# Altium footprint library PcbLib.PcbLib: 68 footprints (part 4 of 5)
Each footprint in its own frame and in the unit in brackets; x right, y up, seen from the top. Pads: shape width x height; smd on the part's side, far side on the other; paste and mask are expansions set on the pad; w line width, h text height; cw(c..) or ccw(c..) is an arc to the next point about the centre after c.
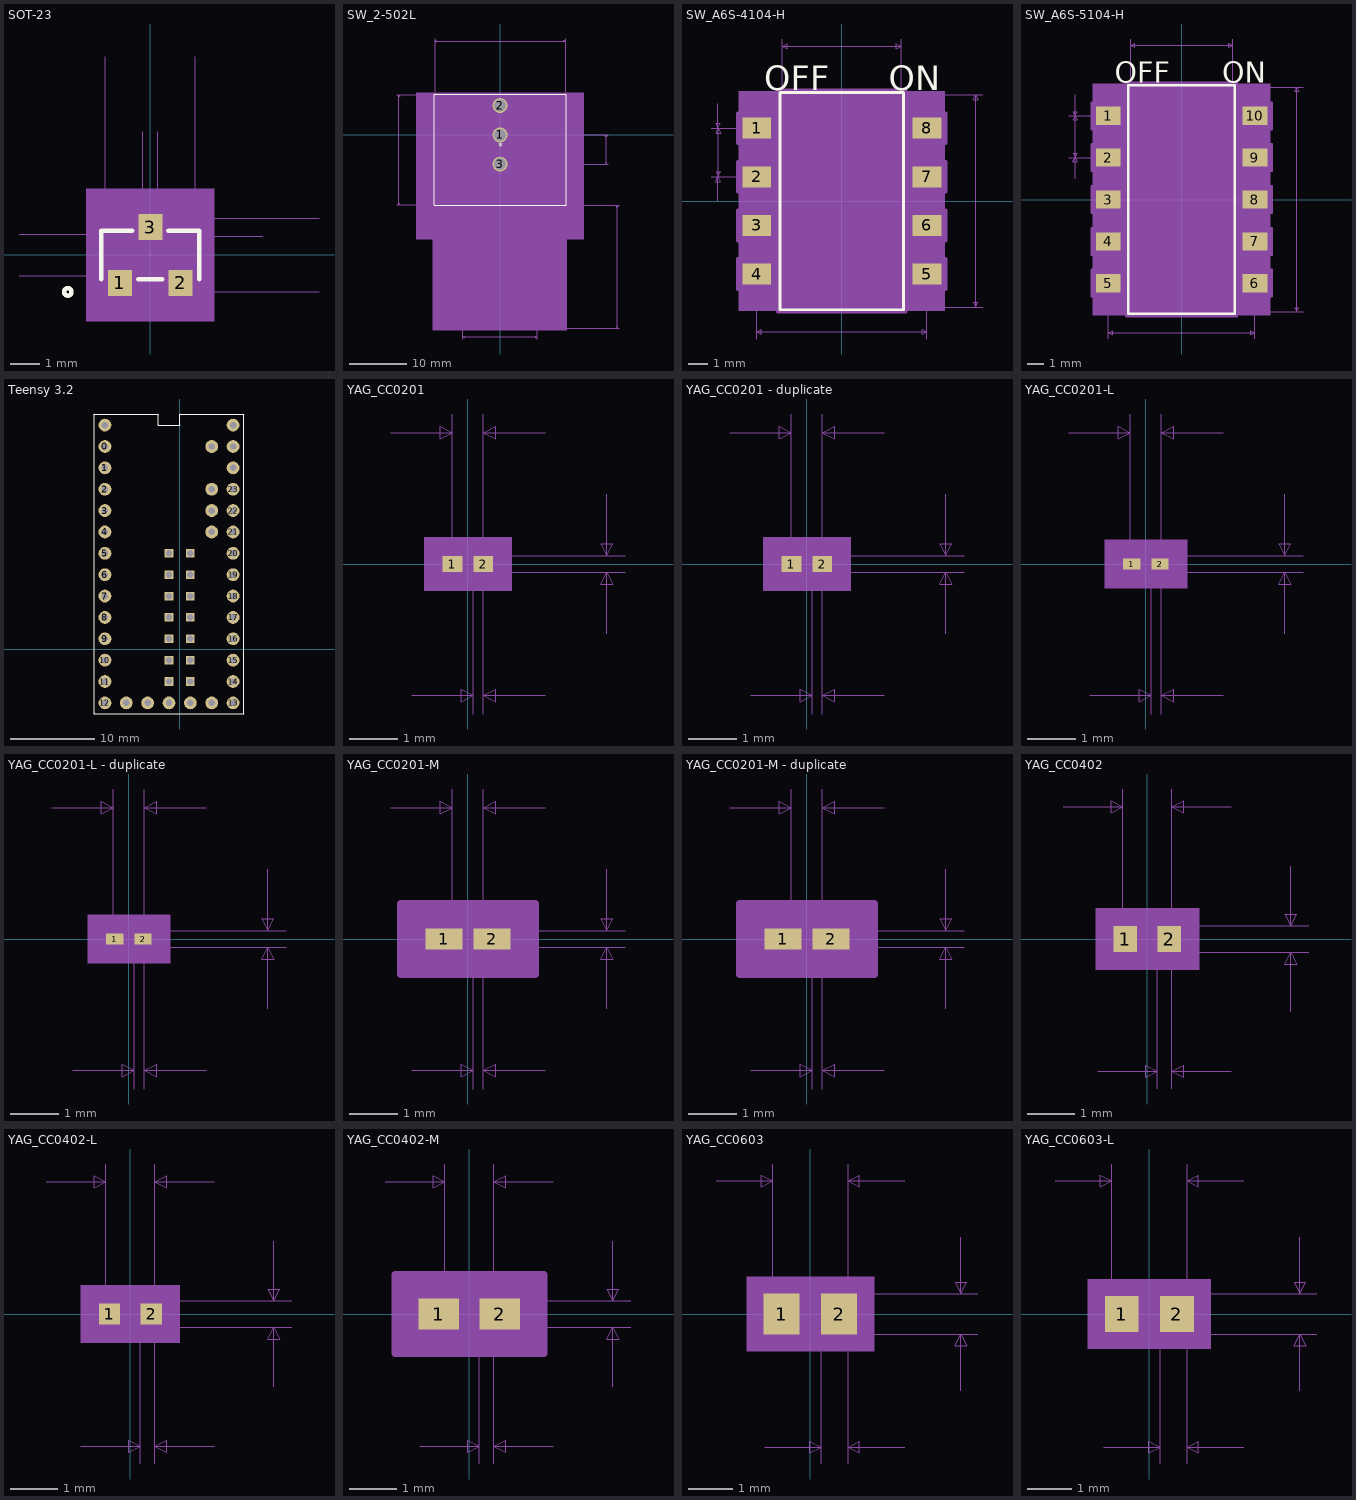
[diagram p3: the footprints below, top view; thin cyan lines are the x and y axes]

## SOT-23 [mil]
pads (3):
  rect 32x35 smd paste+0 mask+0: 1(-40.35,-37.2) 2(40.35,-37.2) 3(0,37.2)
Top Overlay:
  circle w6: c-110.04,-49.21 r5
  lines w6: -65.04,-32.56 -65.04,32.56 -24.14,32.56 ; -16.21,-32.56 16.21,-32.56 ; 24.14,32.56 65.04,32.56 65.04,-32.56
Mechanical 5:
  region: -85.04,88.21 85.04,88.21 85.04,-88.21 -85.04,-88.21
Mechanical 7:
  lines w1: -175.04,-27.56 0,-27.56 ; -175.04,27.56 0,27.56 ; -60.04,27.56 -60.04,264.21 ; -10.04,49.21 -10.04,164.21 ; 0,-49.21 225.04,-49.21 ; 0,25.2 150.04,25.2 ; 10.04,49.21 10.04,164.21 ; 60.04,27.56 60.04,264.21 ; 150.04,49.21 0,49.21 225.04,49.21
Mechanical 13:
  circle w0: c-50.04,-17.56 r5
  lines w1: -60.04,-27.56 60.04,-27.56 60.04,27.56 -60.04,27.56 -60.04,-27.56 ; -50.39,-49.21 -50.39,-27.56 -30.32,-27.56 -30.32,-49.21 -50.39,-49.21 ; -10.04,27.56 10.04,27.56 10.04,49.21 -10.04,49.21 -10.04,27.56 ; 30.32,-49.21 30.32,-27.56 50.39,-27.56 50.39,-49.21 30.32,-49.21
Mechanical 15:
  region: -70.04,-37.56 -70.04,37.56 -20.04,37.56 -20.04,60 20,60 20.04,37.56 70.04,37.56 70.04,-37.56 60.39,-37.56 60.39,-60 -60.39,-60 -60.39,-37.56
  region: 60.04,-27.56 -60.04,-27.56 -60.04,27.56 60.04,27.56
  lines w6: -60.39,-60 -60.39,-37.56 -70.04,-37.56 -70.04,37.56 -20.04,37.56 -20,60 ; -60,-60 60,-60 ; -20.04,60 20.04,60 20.04,37.56 70.04,37.56 70.04,-37.56 60.39,-37.56 60.39,-60
3D body: height 10, standoff 0, extent 0,0 10,10

## SW_2-502L [mil]
pads (3):
  round 102 hole 82 mask+0: 1(0,0) 2(0,200) 3(0,-200)
Top Overlay:
  lines w6: -450,-480.19 450,-480.19 450,276.81 -450,276.81 -450,-480.19
  text "*" at -12.5,-100 h50
Mechanical 5:
  region: -570,286.81 570,286.81 570,-710.19 -570,-710.19
Mechanical 7:
  lines w1: -704.93,-475.19 -445,-475.19 ; -704.93,271.81 -445,271.81 -445,653.51 ; -255,-1391.55 -255,-1319.19 ; 0,-200 737.63,-200 ; 0,0 737.63,0 ; 255,-1391.55 255,-1319.19 813.44,-1319.19 ; 255,-480.19 813.44,-480.19 ; 445,271.81 445,653.51 ; -689.93,-475.19 -689.93,271.81 ; -689.93,-475.19 -694.93,-465.19 -684.93,-465.19 -689.93,-475.19 ; -689.93,271.81 -684.93,261.81 -694.93,261.81 -689.93,271.81 ; -445,638.51 445,638.51 ; -445,638.51 -435,643.5 -435,633.51 -445,638.51 ; -255,-1376.55 255,-1376.55 ; -255,-1376.55 -245,-1371.55 -245,-1381.55 -255,-1376.55 ; 255,-1376.55 245,-1381.55 245,-1371.55 255,-1376.55 ; 445,638.51 435,633.51 435,643.5 445,638.51 ; 722.63,-200 722.63,0 ; 722.63,-200 717.63,-190 727.63,-190 722.63,-200 ; 722.63,0 727.63,-10 717.63,-10 722.63,0 ; 798.44,-1319.19 798.44,-480.19 ; 798.44,-1319.19 793.44,-1309.19 803.44,-1309.19 798.44,-1319.19 ; 798.44,-480.19 803.44,-490.19 793.44,-490.19 798.44,-480.19
  text "Default Padstyle: EX102Y102D82P" at -387.5,-1469.19 h50
  text "First Mounting Padstyle: EX43Y43D50P" at -450,-1529.19 h50
  text "Second Mounting Padstyle: EX70Y70D70P" at -462.5,-1589.19 h50
  text "Alt 1 Padstyle: OX60Y90D30P" at -337.5,-1649.19 h50
  text "Alt 2 Padstyle: OX90Y60D30P" at -337.5,-1709.19 h50
  text "0.89in/22.606mm" at -93.75,658.51 h25
  text "0.747in/18.974mm" at -909.93,-114.19 h25
  text "0.2in/5.08mm" at 742.63,-112.5 h25
  text "0.839in/21.311mm" at 818.44,-912.19 h25
  text "0.51in/12.954mm" at -93.75,-1421.55 h25
Mechanical 13:
  lines w1: -255,-475.19 -255,-1319.19 255,-1319.19 255,-475.19 ; -445,-475.19 445,-475.19 445,271.81 -445,271.81 -445,-475.19
  text "*" at -87.5,-25 h50
Mechanical 15:
  region: 455,281.81 -455,281.81 -455,-1329.19 455,-1329.19
  region: 445,271.81 -445,271.81 -445,-475.19 445,-475.19
  lines w6: -455,-1329.19 -455,281.81 455,281.81 455,-1329.19 -455,-1329.19
3D body: height 10, standoff 0, extent 0,0 10,10

## SW_A6S-4104-H [mm]
pads (8):
  rect 1.5x1.1 smd paste+0 mask+0: 1(-4.45,3.81) 2(-4.45,1.27) 3(-4.45,-1.27) 4(-4.45,-3.81) 5(4.45,-3.81) 6(4.45,-1.27) 7(4.45,1.27) 8(4.45,3.81)
Top Overlay:
  lines w0.152: -3.227,-5.677 -3.227,5.677 3.227,5.677 3.227,-5.677 -3.227,-5.677
  text "OFF" at -4.052,5.804 h1.27
  text "ON" at 2.465,5.804 h1.27
Mechanical 5:
  region: 5.39,-5.741 -5.39,-5.741 -5.39,5.741 5.39,5.741
Mechanical 7:
  lines w0.025: -6.827,1.27 -4.45,1.27 -6.724,1.27 ; -6.827,3.81 -4.45,3.81 -6.724,3.81 ; -6.47,0 -6.47,1.27 ; -6.47,5.08 -6.47,3.81 ; -4.45,-7.205 -4.45,-3.81 -4.45,-7.074 ; -3.18,-6.82 -4.45,-6.82 ; -3.1,3.81 -3.1,8.471 ; 3.1,3.81 3.1,8.471 ; 3.18,-6.82 4.45,-6.82 ; 4.45,-7.205 4.45,-3.81 4.45,-7.074 ; 4.45,-5.55 7.371,-5.55 ; 4.45,5.55 7.371,5.55 ; -6.47,1.27 -6.597,1.016 -6.343,1.016 -6.47,1.27 ; -6.47,3.81 -6.597,4.064 -6.343,4.064 -6.47,3.81 ; -6.446,1.27 -6.573,1.524 -6.319,1.524 -6.446,1.27 ; -6.446,1.27 -6.446,3.81 ; -6.446,3.81 -6.573,3.556 -6.319,3.556 -6.446,3.81 ; -4.45,-6.824 -4.196,-6.951 -4.196,-6.697 -4.45,-6.824 ; -4.45,-6.824 4.45,-6.824 ; -4.45,-6.82 -4.196,-6.693 -4.196,-6.947 -4.45,-6.82 ; -3.1,8.09 -2.846,7.963 -2.846,8.217 -3.1,8.09 ; -3.1,8.09 3.1,8.09 ; 3.1,8.09 2.846,7.963 2.846,8.217 3.1,8.09 ; 4.45,-6.824 4.196,-6.697 4.196,-6.951 4.45,-6.824 ; 4.45,-6.82 4.196,-6.693 4.196,-6.947 4.45,-6.82 ; 6.99,-5.55 7.117,-5.296 6.863,-5.296 6.99,-5.55 ; 6.99,-5.55 6.99,5.55 ; 6.99,5.55 7.117,5.296 6.863,5.296 6.99,5.55
  text "0.437in/11.1mm" at 7.498,-0.318 h0.64
  text "0.244in/6.2mm" at -2.064,8.598 h0.64
  text "Alt 2 Padstyle: OX90Y60D30P" at -8.572,-18.25 h1.27
  text "Alt 1 Padstyle: OX60Y90D30P" at -8.572,-16.726 h1.27
  text "Default Padstyle: RX59p06Y43p31D0T" at -10.795,-12.154 h1.27
  text "0.35in/8.9mm" at -1.905,-7.967 h0.64
  text "0.1in/2.54mm" at -10.764,2.222 h0.64
Mechanical 13:
  region: 0,-4.36 0,-3.26 1.55,-3.26 1.55,-4.36
  region: 0,-1.82 0,-0.72 1.55,-0.72 1.55,-1.82
  region: 0,0.72 0,1.82 1.55,1.82 1.55,0.72
  region: 0,3.26 0,4.36 1.55,4.36 1.55,3.26
  lines w0: -0.305,5.55 ccw(c0,5.55) 0.305,5.55
  lines w0.025: -3.1,-5.55 -3.1,5.55 3.1,5.55 3.1,-5.55 -3.1,-5.55 ; -1.55,-4.36 -1.55,-3.26 1.55,-3.26 1.55,-4.36 -1.55,-4.36 ; -1.55,-1.82 -1.55,-0.72 1.55,-0.72 1.55,-1.82 -1.55,-1.82 ; -1.55,0.72 -1.55,1.82 1.55,1.82 1.55,0.72 -1.55,0.72 ; -1.55,3.26 -1.55,4.36 1.55,4.36 1.55,3.26 -1.55,3.26
  text "OFF" at -4.052,5.804 h1.27
  text "ON" at 2.465,5.804 h1.27
Mechanical 15:
  region: -3.354,-2.074 -3.354,-3.006 -5.454,-3.006 -5.454,-4.614 -3.354,-4.614 -3.354,-5.804 3.354,-5.804 3.354,-4.614 5.454,-4.614 5.454,-3.006 3.354,-3.006 3.354,-2.074 5.454,-2.074 5.454,-0.466 3.354,-0.466 3.354,0.466 5.454,0.466 5.454,2.074 3.354,2.074 3.354,3.006 5.454,3.006 5.454,4.614 3.354,4.614 3.354,5.804 -3.354,5.804 -3.354,4.614 -5.454,4.614 -5.454,3.006 -3.354,3.006 -3.354,2.074 -5.454,2.074 -5.454,0.466 -3.354,0.466 -3.354,-0.466 -5.454,-0.466 -5.454,-2.074
  lines w0.152: -5.454,-4.614 -3.354,-4.614 -3.354,-5.804 3.354,-5.804 3.354,-4.614 5.454,-4.614 5.454,-3.006 3.354,-3.006 3.354,-2.074 5.454,-2.074 5.454,-0.466 3.354,-0.466 3.354,0.466 5.454,0.466 5.454,2.074 3.354,2.074 3.354,3.006 5.454,3.006 5.454,4.614 3.354,4.614 3.354,5.804 -3.354,5.804 -3.354,4.614 -5.454,4.614 -5.454,3.006 -3.354,3.006 -3.354,2.074 -5.454,2.074 -5.454,0.466 -3.354,0.466 -3.354,-0.466 -5.454,-0.466 -5.454,-2.074 -3.354,-2.074 -3.354,-3.006 -5.454,-3.006 -5.454,-4.614
3D body: height 0.25, standoff 0, extent 0,0 0.254,0.254

## SW_A6S-5104-H [mm]
pads (10):
  rect 1.5x1.1 smd paste+0 mask+0: 1(-4.45,5.08) 2(-4.45,2.54) 3(-4.45,0) 4(-4.45,-2.54) 5(-4.45,-5.08) 6(4.45,-5.08) 7(4.45,-2.54) 8(4.45,0) 9(4.45,2.54) 10(4.45,5.08)
Top Overlay:
  lines w0.152: -3.227,-6.947 -3.227,6.947 3.227,6.947 3.227,-6.947 -3.227,-6.947
  text "OFF" at -4.052,7.074 h1.27
  text "ON" at 2.465,7.074 h1.27
Mechanical 5:
  region: 5.39,-7.01 -5.39,-7.01 -5.39,7.01 5.39,7.01
Mechanical 7:
  lines w0.025: -6.845,2.54 -4.45,2.54 -6.724,2.54 ; -6.845,5.08 -4.45,5.08 -6.724,5.08 ; -6.47,1.27 -6.47,2.54 ; -6.47,6.35 -6.47,5.08 ; -4.45,-8.465 -4.45,-5.08 -4.45,-8.344 ; -3.18,-8.09 -4.45,-8.09 ; -3.1,5.08 -3.1,9.741 ; 3.1,5.08 3.1,9.741 ; 3.18,-8.09 4.45,-8.09 ; 4.45,-8.465 4.45,-5.08 4.45,-8.344 ; 4.45,-6.82 7.371,-6.82 ; 4.45,6.82 7.371,6.82 ; -6.47,2.54 -6.597,2.286 -6.343,2.286 -6.47,2.54 ; -6.47,5.08 -6.597,5.334 -6.343,5.334 -6.47,5.08 ; -6.464,2.54 -6.591,2.794 -6.337,2.794 -6.464,2.54 ; -6.464,2.54 -6.464,5.08 ; -6.464,5.08 -6.591,4.826 -6.337,4.826 -6.464,5.08 ; -4.45,-8.09 -4.196,-7.963 -4.196,-8.217 -4.45,-8.09 ; -4.45,-8.084 -4.196,-8.211 -4.196,-7.957 -4.45,-8.084 ; -4.45,-8.084 4.45,-8.084 ; -3.1,9.36 -2.846,9.233 -2.846,9.487 -3.1,9.36 ; -3.1,9.36 3.1,9.36 ; 3.1,9.36 2.846,9.233 2.846,9.487 3.1,9.36 ; 4.45,-8.09 4.196,-7.963 4.196,-8.217 4.45,-8.09 ; 4.45,-8.084 4.196,-7.957 4.196,-8.211 4.45,-8.084 ; 6.99,-6.82 7.117,-6.566 6.863,-6.566 6.99,-6.82 ; 6.99,-6.82 6.99,6.82 ; 6.99,6.82 7.117,6.566 6.863,6.566 6.99,6.82
  text "0.537in/13.64mm" at 7.498,-0.318 h0.64
  text "0.244in/6.2mm" at -2.064,9.868 h0.64
  text "Alt 2 Padstyle: OX90Y60D30P" at -8.572,-19.52 h1.27
  text "Alt 1 Padstyle: OX60Y90D30P" at -8.572,-17.996 h1.27
  text "Default Padstyle: RX59p06Y43p31D0T" at -10.795,-13.424 h1.27
  text "0.35in/8.9mm" at -1.905,-9.227 h0.64
  text "0.1in/2.54mm" at -10.782,3.492 h0.64
Mechanical 13:
  region: 0,-5.63 0,-4.53 1.55,-4.53 1.55,-5.63
  region: 0,-3.09 0,-1.99 1.55,-1.99 1.55,-3.09
  region: 0,-0.55 0,0.55 1.55,0.55 1.55,-0.55
  region: 0,1.99 0,3.09 1.55,3.09 1.55,1.99
  region: 0,4.53 0,5.63 1.55,5.63 1.55,4.53
  lines w0: -0.305,6.82 ccw(c0,6.82) 0.305,6.82
  lines w0.025: -3.1,-6.82 -3.1,6.82 3.1,6.82 3.1,-6.82 -3.1,-6.82 ; -1.55,-5.63 -1.55,-4.53 1.55,-4.53 1.55,-5.63 -1.55,-5.63 ; -1.55,-3.09 -1.55,-1.99 1.55,-1.99 1.55,-3.09 -1.55,-3.09 ; -1.55,-0.55 -1.55,0.55 1.55,0.55 1.55,-0.55 -1.55,-0.55 ; -1.55,1.99 -1.55,3.09 1.55,3.09 1.55,1.99 -1.55,1.99 ; -1.55,4.53 -1.55,5.63 1.55,5.63 1.55,4.53 -1.55,4.53
  text "OFF" at -4.052,7.074 h1.27
  text "ON" at 2.465,7.074 h1.27
Mechanical 15:
  region: -5.454,-3.344 -3.354,-3.344 -3.354,-4.276 -5.454,-4.276 -5.454,-5.884 -3.354,-5.884 -3.354,-7.074 3.354,-7.074 3.354,-5.884 5.454,-5.884 5.454,-4.276 3.354,-4.276 3.354,-3.344 5.454,-3.344 5.454,-1.736 3.354,-1.736 3.354,-0.804 5.454,-0.804 5.454,0.804 3.354,0.804 3.354,1.736 5.454,1.736 5.454,3.344 3.354,3.344 3.354,4.276 5.454,4.276 5.454,5.884 3.354,5.884 3.354,7.074 -3.354,7.074 -3.354,5.884 -5.454,5.884 -5.454,4.276 -3.354,4.276 -3.354,3.344 -5.454,3.344 -5.454,1.736 -3.354,1.736 -3.354,0.804 -5.454,0.804 -5.454,-0.804 -3.354,-0.804 -3.354,-1.736 -5.454,-1.736
  lines w0.152: -5.454,-5.884 -3.354,-5.884 -3.354,-7.074 3.354,-7.074 3.354,-5.884 5.454,-5.884 5.454,-4.276 3.354,-4.276 3.354,-3.344 5.454,-3.344 5.454,-1.736 3.354,-1.736 3.354,-0.804 5.454,-0.804 5.454,0.804 3.354,0.804 3.354,1.736 5.454,1.736 5.454,3.344 3.354,3.344 3.354,4.276 5.454,4.276 5.454,5.884 3.354,5.884 3.354,7.074 -3.354,7.074 -3.354,5.884 -5.454,5.884 -5.454,4.276 -3.354,4.276 -3.354,3.344 -5.454,3.344 -5.454,1.736 -3.354,1.736 -3.354,0.804 -5.454,0.804 -5.454,-0.804 -3.354,-0.804 -3.354,-1.736 -5.454,-1.736 -5.454,-3.344 -3.354,-3.344 -3.354,-4.276 -5.454,-4.276 -5.454,-5.884
3D body: height 0.25, standoff 0, extent 0,0 0.254,0.254

## Teensy 3.2 [mil]
pads (51):
  round 60 hole 30: 0(-350,950) 1(-350,850) 2(-350,750) 3(-350,650) 3.3(-150,-250) 3.3(250,850) 4(-350,550) 5(-350,450) 6(-350,350) 7(-350,250) 8(-350,150) 9(-350,50) 10(-350,-50) 11(-350,-150) 12(-350,-250) 13(250,-250) 14(250,-150) 15(250,-50) 16(250,50) 17(250,150) 18(250,250) 19(250,350) 20(250,450) 21(250,550) 22(250,650) 23(250,750) A10(150,650) A11(150,550) A14(150,-250) AGND(250,950) AREF(150,750) GND(-350,1050) GND(-50,-250) PGM(50,-250) VBAT(-250,-250) VIN(250,1050) VUSB(150,950)
  rect 40x40 hole 30: 3.3(50,350) 24(-50,250) 25(-50,150) 26(-50,50) 27(-50,-50) 28(-50,-150) 29(50,-150) 30(50,-50) 31(50,50) 32(50,150) 33(50,250) A12(-50,450) A13(50,450) GND(-50,350)
Bottom Layer:
  lines w2: -402,-300 ccw(c-400,-300) -398,-300 ; -402,1100 cw(c-400,1100) -398,1100 ; -400,-302 cw(c-400,-300) -400,-298 ; -400,1098 cw(c-400,1100) -400,1102 ; -102,1050 ccw(c-100,1050) -98,1050 ; -102,1100 cw(c-100,1100) -98,1100 ; -100,1048 cw(c-100,1050) -100,1052 ; -100,1098 ccw(c-100,1100) -100,1102 ; -2,1050 ccw(c0,1050) 2,1050 ; -2,1100 cw(c0,1100) 2,1100 ; 0,1048 ccw(c0,1050) 0,1052 ; 0,1098 cw(c0,1100) 0,1102 ; 298,-300 ccw(c300,-300) 302,-300 ; 298,1100 cw(c300,1100) 302,1100 ; 300,-302 ccw(c300,-300) 300,-298 ; 300,1098 ccw(c300,1100) 300,1102
Top Overlay:
  circle w10: c-250,-250 r0.12
  circle w10: c-150,-250 r0.12
  circle w10: c-59.07,-250 r0.12
  circle w10: c50,-250 r0.12
  circle w10: c150,-250 r0.12
  circle w10: c250,-264.5 r0.12
  circle w10: c250,-150 r0.12
  circle w10: c250,-50 r0.12
  circle w10: c250,50 r0.12
  circle w10: c250,150 r0.12
  circle w10: c250,250 r0.12
  circle w10: c250,350 r0.12
  circle w10: c250,450 r0.12
  circle w10: c250,550 r0.12
  circle w10: c150,550 r0.12
  circle w10: c150,650 r0.12
  circle w10: c250,650 r0.12
  circle w10: c150,750 r0.12
  circle w10: c250,750 r0.12
  circle w10: c250,850 r0.12
  circle w10: c250,950 r0.12
  circle w10: c150,950 r0.12
  circle w10: c250,1050 r0.12
  circle w10: c-350,950 r0.12
  circle w10: c-350,1050 r0.12
  circle w10: c-350,950 r0.12
  circle w10: c-350,850 r0.12
  circle w10: c-350,750 r0.12
  circle w10: c-350,650 r0.12
  circle w10: c-350,550 r0.12
  circle w10: c-350,450 r0.12
  circle w10: c-350,350 r0.12
  circle w10: c-350,250 r0.12
  circle w10: c-350,150 r0.12
  circle w10: c-350,50 r0.12
  circle w10: c-350,-50 r0.12
  circle w10: c-350,-150 r0.12
  circle w10: c-350,-250 r0.12
  circle w10: c-50,-150 r0.12
  circle w10: c50,-150 r0.12
  circle w10: c50,-50 r0.12
  circle w10: c-50,-50 r0.12
  circle w10: c50,50 r0.12
  circle w10: c-50,50 r0.12
  circle w10: c-50,150 r0.12
  circle w10: c50,150 r0.12
  circle w10: c50,250 r0.12
  circle w10: c-50,250 r0.12
  circle w10: c50,350 r0.12
  circle w10: c-50,350 r0.12
  circle w10: c-50,450 r0.12
  circle w10: c50,450 r0.12
  lines w4: -400,-300 -400,1100 -100,1100 -100,1050 0,1050 0,1100 300,1100 300,-300 -400,-300
3D body "Teensy_3-2.STEP": height 172.87, standoff -78.74, extent -400,-300 303.72,1156.68

## YAG_CC0201 [mil]
pads (2):
  rect 16x13 smd paste+0 mask+0: 1(-12.5,0) 2(12.5,0)
Mechanical 5:
  region: 35.5,-21.5 -35.5,-21.5 -35.5,21.5 35.5,21.5
Mechanical 7:
  lines w1: -62.5,106.5 -12.5,106.5 ; -45.5,-106.5 4.5,-106.5 ; -12.5,0 -12.5,121.5 ; 0,-6.5 127.5,-6.5 ; 0,6.5 127.5,6.5 ; 4.5,-121.5 4.5,0 ; 12.5,-121.5 12.5,0 12.5,121.5 ; 62.5,-106.5 12.5,-106.5 ; 62.5,106.5 12.5,106.5 ; 112.5,-56.5 112.5,-6.5 ; 112.5,56.5 112.5,6.5 ; -12.5,106.5 -22.5,111.5 -22.5,101.5 -12.5,106.5 ; 4.5,-106.5 -5.5,-101.5 -5.5,-111.5 4.5,-106.5 ; 12.5,-106.5 22.5,-101.5 22.5,-111.5 12.5,-106.5 ; 12.5,106.5 22.5,111.5 22.5,101.5 12.5,106.5 ; 112.5,-6.5 107.5,-16.5 117.5,-16.5 112.5,-6.5 ; 112.5,6.5 107.5,16.5 117.5,16.5 112.5,6.5
  text "Default Padstyle: RX16Y13D0T" at -350,-276.5 h50
  text "Alternate 1 Padstyle: OX60Y90D30P" at -412.5,-376.5 h50
  text "Alternate 2 Padstyle: OX90Y60D30P" at -412.5,-476.5 h50
  text "0.013in/0.33mm" at 132.5,-12.5 h25
  text "0.025in/0.635mm" at -93.75,126.5 h25
  text "0.008in/0.203mm" at -85.25,-151.5 h25
Mechanical 13:
  lines w1: -12.5,-6.5 -12.5,6.5 ; -12.5,-6.5 -4.5,-6.5 -4.5,6.5 -12.5,6.5 ; -12.5,-6.5 12.5,-6.5 ; -12.5,-6.5 -12.5,6.5 ; -12.5,6.5 12.5,6.5 ; 12.5,-6.5 4.5,-6.5 4.5,6.5 12.5,6.5 ; 12.5,-6.5 12.5,6.5 ; 12.5,-6.5 12.5,6.5
Mechanical 15:
  region: 30.5,-16.5 -30.5,-16.5 -30.5,16.5 30.5,16.5
  lines w6: -30.5,-16.5 -30.5,16.5 30.5,16.5 30.5,-16.5 -30.5,-16.5
3D body: height 10, standoff 0, extent 0,0 10,10

## YAG_CC0201 - duplicate [mil]
pads (2):
  rect 16x13 smd paste+0 mask+0: 1(-12.5,0) 2(12.5,0)
Mechanical 5:
  region: 35.5,-21.5 -35.5,-21.5 -35.5,21.5 35.5,21.5
Mechanical 7:
  lines w1: -62.5,106.5 -12.5,106.5 ; -45.5,-106.5 4.5,-106.5 ; -12.5,0 -12.5,121.5 ; 0,-6.5 127.5,-6.5 ; 0,6.5 127.5,6.5 ; 4.5,-121.5 4.5,0 ; 12.5,-121.5 12.5,0 12.5,121.5 ; 62.5,-106.5 12.5,-106.5 ; 62.5,106.5 12.5,106.5 ; 112.5,-56.5 112.5,-6.5 ; 112.5,56.5 112.5,6.5 ; -12.5,106.5 -22.5,101.5 -22.5,111.5 -12.5,106.5 ; 4.5,-106.5 -5.5,-111.5 -5.5,-101.5 4.5,-106.5 ; 12.5,-106.5 22.5,-111.5 22.5,-101.5 12.5,-106.5 ; 12.5,106.5 22.5,101.5 22.5,111.5 12.5,106.5 ; 112.5,-6.5 117.5,-16.5 107.5,-16.5 112.5,-6.5 ; 112.5,6.5 117.5,16.5 107.5,16.5 112.5,6.5
  text "0.008in/0.203mm" at -85.25,-151.5 h25
  text "0.025in/0.635mm" at -93.75,126.5 h25
  text "0.013in/0.33mm" at 132.5,-12.5 h25
  text "Alternate 2 Padstyle: OX90Y60D30P" at -412.5,-476.5 h50
  text "Alternate 1 Padstyle: OX60Y90D30P" at -412.5,-376.5 h50
  text "Default Padstyle: RX16Y13D0T" at -350,-276.5 h50
Mechanical 13:
  lines w1: -12.5,-6.5 -12.5,6.5 ; -12.5,-6.5 12.5,-6.5 ; -12.5,-6.5 -4.5,-6.5 -4.5,6.5 -12.5,6.5 ; -12.5,-6.5 -12.5,6.5 ; -12.5,6.5 12.5,6.5 ; 12.5,-6.5 12.5,6.5 ; 12.5,-6.5 12.5,6.5 ; 12.5,-6.5 4.5,-6.5 4.5,6.5 12.5,6.5
Mechanical 15:
  region: 30.5,-16.5 -30.5,-16.5 -30.5,16.5 30.5,16.5
  lines w6: -30.5,-16.5 30.5,-16.5 30.5,16.5 -30.5,16.5 -30.5,-16.5
3D body: height 10, standoff 0, extent 0,0 10,10

## YAG_CC0201-L [mil]
pads (2):
  rect 14x9 smd paste+0 mask+0: 1(-11.5,0) 2(11.5,0)
Mechanical 5:
  region: 33.5,-19.5 -33.5,-19.5 -33.5,19.5 33.5,19.5
Mechanical 7:
  lines w1: -62.5,106.5 -12.5,106.5 ; -45.5,-106.5 4.5,-106.5 ; -12.5,0 -12.5,121.5 ; 0,-6.5 127.5,-6.5 ; 0,6.5 127.5,6.5 ; 4.5,-121.5 4.5,0 ; 12.5,-121.5 12.5,0 12.5,121.5 ; 62.5,-106.5 12.5,-106.5 ; 62.5,106.5 12.5,106.5 ; 112.5,-56.5 112.5,-6.5 ; 112.5,56.5 112.5,6.5 ; -12.5,106.5 -22.5,101.5 -22.5,111.5 -12.5,106.5 ; 4.5,-106.5 -5.5,-111.5 -5.5,-101.5 4.5,-106.5 ; 12.5,-106.5 22.5,-111.5 22.5,-101.5 12.5,-106.5 ; 12.5,106.5 22.5,101.5 22.5,111.5 12.5,106.5 ; 112.5,-6.5 117.5,-16.5 107.5,-16.5 112.5,-6.5 ; 112.5,6.5 117.5,16.5 107.5,16.5 112.5,6.5
  text "0.008in/0.203mm" at -85.25,-151.5 h25
  text "0.025in/0.635mm" at -93.75,126.5 h25
  text "0.013in/0.33mm" at 132.5,-12.5 h25
  text "Alternate 2 Padstyle: OX90Y60D30P" at -412.5,-474.5 h50
  text "Alternate 1 Padstyle: OX60Y90D30P" at -412.5,-374.5 h50
  text "Default Padstyle: RX14Y9D0T" at -337.5,-274.5 h50
Mechanical 13:
  lines w1: -12.5,-6.5 -12.5,6.5 ; -12.5,-6.5 12.5,-6.5 ; -12.5,-6.5 -4.5,-6.5 -4.5,6.5 -12.5,6.5 ; -12.5,-6.5 -12.5,6.5 ; -12.5,6.5 12.5,6.5 ; 12.5,-6.5 12.5,6.5 ; 12.5,-6.5 12.5,6.5 ; 12.5,-6.5 4.5,-6.5 4.5,6.5 12.5,6.5
Mechanical 15:
  region: 22.5,-8.5 -22.5,-8.5 -22.5,8.5 22.5,8.5
  lines w6: -22.5,-8.5 22.5,-8.5 22.5,8.5 -22.5,8.5 -22.5,-8.5
3D body: height 10, standoff 0, extent 0,0 10,10

## YAG_CC0201-L - duplicate [mil]
pads (2):
  rect 14x9 smd paste+0 mask+0: 1(-11.5,0) 2(11.5,0)
Mechanical 5:
  region: 33.5,-19.5 -33.5,-19.5 -33.5,19.5 33.5,19.5
Mechanical 7:
  lines w1: -62.5,106.5 -12.5,106.5 ; -45.5,-106.5 4.5,-106.5 ; -12.5,0 -12.5,121.5 ; 0,-6.5 127.5,-6.5 ; 0,6.5 127.5,6.5 ; 4.5,-121.5 4.5,0 ; 12.5,-121.5 12.5,0 12.5,121.5 ; 62.5,-106.5 12.5,-106.5 ; 62.5,106.5 12.5,106.5 ; 112.5,-56.5 112.5,-6.5 ; 112.5,56.5 112.5,6.5 ; -12.5,106.5 -22.5,101.5 -22.5,111.5 -12.5,106.5 ; 4.5,-106.5 -5.5,-111.5 -5.5,-101.5 4.5,-106.5 ; 12.5,-106.5 22.5,-111.5 22.5,-101.5 12.5,-106.5 ; 12.5,106.5 22.5,101.5 22.5,111.5 12.5,106.5 ; 112.5,-6.5 117.5,-16.5 107.5,-16.5 112.5,-6.5 ; 112.5,6.5 117.5,16.5 107.5,16.5 112.5,6.5
  text "0.008in/0.203mm" at -85.25,-151.5 h25
  text "0.025in/0.635mm" at -93.75,126.5 h25
  text "0.013in/0.33mm" at 132.5,-12.5 h25
  text "Alternate 2 Padstyle: OX90Y60D30P" at -412.5,-474.5 h50
  text "Alternate 1 Padstyle: OX60Y90D30P" at -412.5,-374.5 h50
  text "Default Padstyle: RX14Y9D0T" at -337.5,-274.5 h50
Mechanical 13:
  lines w1: -12.5,-6.5 -12.5,6.5 ; -12.5,-6.5 12.5,-6.5 ; -12.5,-6.5 -4.5,-6.5 -4.5,6.5 -12.5,6.5 ; -12.5,-6.5 -12.5,6.5 ; -12.5,6.5 12.5,6.5 ; 12.5,-6.5 12.5,6.5 ; 12.5,-6.5 12.5,6.5 ; 12.5,-6.5 4.5,-6.5 4.5,6.5 12.5,6.5
Mechanical 15:
  region: 22.5,-8.5 -22.5,-8.5 -22.5,8.5 22.5,8.5
  lines w6: -22.5,-8.5 22.5,-8.5 22.5,8.5 -22.5,8.5 -22.5,-8.5
3D body: height 10, standoff 0, extent 0,0 10,10

## YAG_CC0201-M [mil]
pads (2):
  rect 30x17 smd paste+0 mask+0: 1(-19.5,0) 2(19.5,0)
Mechanical 5:
  region: 49.5,-23.5 -49.5,-23.5 -49.5,23.5 49.5,23.5
Mechanical 7:
  lines w1: -62.5,106.5 -12.5,106.5 ; -45.5,-106.5 4.5,-106.5 ; -12.5,0 -12.5,121.5 ; 0,-6.5 127.5,-6.5 ; 0,6.5 127.5,6.5 ; 4.5,-121.5 4.5,0 ; 12.5,-121.5 12.5,0 12.5,121.5 ; 62.5,-106.5 12.5,-106.5 ; 62.5,106.5 12.5,106.5 ; 112.5,-56.5 112.5,-6.5 ; 112.5,56.5 112.5,6.5 ; -12.5,106.5 -22.5,111.5 -22.5,101.5 -12.5,106.5 ; 4.5,-106.5 -5.5,-101.5 -5.5,-111.5 4.5,-106.5 ; 12.5,-106.5 22.5,-101.5 22.5,-111.5 12.5,-106.5 ; 12.5,106.5 22.5,111.5 22.5,101.5 12.5,106.5 ; 112.5,-6.5 107.5,-16.5 117.5,-16.5 112.5,-6.5 ; 112.5,6.5 107.5,16.5 117.5,16.5 112.5,6.5
  text "Default Padstyle: RX30Y17D0T" at -350,-278.5 h50
  text "Alternate 1 Padstyle: OX60Y90D30P" at -412.5,-378.5 h50
  text "Alternate 2 Padstyle: OX90Y60D30P" at -412.5,-478.5 h50
  text "0.013in/0.33mm" at 132.5,-12.5 h25
  text "0.025in/0.635mm" at -93.75,126.5 h25
  text "0.008in/0.203mm" at -85.25,-151.5 h25
Mechanical 13:
  lines w1: -12.5,-6.5 -12.5,6.5 ; -12.5,-6.5 -4.5,-6.5 -4.5,6.5 -12.5,6.5 ; -12.5,-6.5 12.5,-6.5 ; -12.5,-6.5 -12.5,6.5 ; -12.5,6.5 12.5,6.5 ; 12.5,-6.5 4.5,-6.5 4.5,6.5 12.5,6.5 ; 12.5,-6.5 12.5,6.5 ; 12.5,-6.5 12.5,6.5
Mechanical 15:
  region: 54.5,-28.5 -54.5,-28.5 -54.5,28.5 54.5,28.5
  lines w6: -54.5,-28.5 -54.5,28.5 54.5,28.5 54.5,-28.5 -54.5,-28.5
3D body: height 10, standoff 0, extent 0,0 10,10

## YAG_CC0201-M - duplicate [mil]
pads (2):
  rect 30x17 smd paste+0 mask+0: 1(-19.5,0) 2(19.5,0)
Mechanical 5:
  region: 49.5,-23.5 -49.5,-23.5 -49.5,23.5 49.5,23.5
Mechanical 7:
  lines w1: -62.5,106.5 -12.5,106.5 ; -45.5,-106.5 4.5,-106.5 ; -12.5,0 -12.5,121.5 ; 0,-6.5 127.5,-6.5 ; 0,6.5 127.5,6.5 ; 4.5,-121.5 4.5,0 ; 12.5,-121.5 12.5,0 12.5,121.5 ; 62.5,-106.5 12.5,-106.5 ; 62.5,106.5 12.5,106.5 ; 112.5,-56.5 112.5,-6.5 ; 112.5,56.5 112.5,6.5 ; -12.5,106.5 -22.5,111.5 -22.5,101.5 -12.5,106.5 ; 4.5,-106.5 -5.5,-101.5 -5.5,-111.5 4.5,-106.5 ; 12.5,-106.5 22.5,-101.5 22.5,-111.5 12.5,-106.5 ; 12.5,106.5 22.5,111.5 22.5,101.5 12.5,106.5 ; 112.5,-6.5 107.5,-16.5 117.5,-16.5 112.5,-6.5 ; 112.5,6.5 107.5,16.5 117.5,16.5 112.5,6.5
  text "Default Padstyle: RX30Y17D0T" at -350,-278.5 h50
  text "Alternate 1 Padstyle: OX60Y90D30P" at -412.5,-378.5 h50
  text "Alternate 2 Padstyle: OX90Y60D30P" at -412.5,-478.5 h50
  text "0.013in/0.33mm" at 132.5,-12.5 h25
  text "0.025in/0.635mm" at -93.75,126.5 h25
  text "0.008in/0.203mm" at -85.25,-151.5 h25
Mechanical 13:
  lines w1: -12.5,-6.5 -12.5,6.5 ; -12.5,-6.5 -4.5,-6.5 -4.5,6.5 -12.5,6.5 ; -12.5,-6.5 12.5,-6.5 ; -12.5,-6.5 -12.5,6.5 ; -12.5,6.5 12.5,6.5 ; 12.5,-6.5 4.5,-6.5 4.5,6.5 12.5,6.5 ; 12.5,-6.5 12.5,6.5 ; 12.5,-6.5 12.5,6.5
Mechanical 15:
  region: 54.5,-28.5 -54.5,-28.5 -54.5,28.5 54.5,28.5
  lines w6: -54.5,-28.5 -54.5,28.5 54.5,28.5 54.5,-28.5 -54.5,-28.5
3D body: height 10, standoff 0, extent 0,0 10,10

## YAG_CC0402 [mil]
pads (2):
  rect 20x22 smd paste+0 mask+0: 1(-18.5,0) 2(18.5,0)
Mechanical 5:
  region: 43.5,-26 -43.5,-26 -43.5,26 43.5,26
Mechanical 7:
  lines w1: -70.5,111 -20.5,111 ; -41.5,-111 8.5,-111 ; -20.5,0 -20.5,126 ; 0,-11 135.5,-11 ; 0,11 135.5,11 ; 8.5,-126 8.5,0 ; 20.5,-126 20.5,0 20.5,126 ; 70.5,-111 20.5,-111 ; 70.5,111 20.5,111 ; 120.5,-61 120.5,-11 ; 120.5,61 120.5,11 ; -20.5,111 -30.5,116 -30.5,106 -20.5,111 ; 8.5,-111 -1.5,-106 -1.5,-116 8.5,-111 ; 20.5,-111 30.5,-106 30.5,-116 20.5,-111 ; 20.5,111 30.5,116 30.5,106 20.5,111 ; 120.5,-11 115.5,-21 125.5,-21 120.5,-11 ; 120.5,11 115.5,21 125.5,21 120.5,11
  text "Default Padstyle: RX20Y22D0T" at -350,-281 h50
  text "Alternate 1 Padstyle: OX60Y90D30P" at -412.5,-381 h50
  text "Alternate 2 Padstyle: OX90Y60D30P" at -412.5,-481 h50
  text "0.022in/0.559mm" at 140.5,-12.5 h25
  text "0.041in/1.041mm" at -93.75,131 h25
  text "0.012in/0.305mm" at -79.25,-156 h25
Mechanical 13:
  lines w1: -20.5,-11 -20.5,11 ; -20.5,-11 -8.5,-11 -8.5,11 -20.5,11 ; -20.5,-11 20.5,-11 ; -20.5,-11 -20.5,11 ; -20.5,11 20.5,11 ; 20.5,-11 8.5,-11 8.5,11 20.5,11 ; 20.5,-11 20.5,11 ; 20.5,-11 20.5,11
Mechanical 15:
  region: 38.5,-21 -38.5,-21 -38.5,21 38.5,21
  lines w6: -38.5,-21 -38.5,21 38.5,21 38.5,-21 -38.5,-21
3D body: height 10, standoff 0, extent 0,0 10,10

## YAG_CC0402-L [mil]
pads (2):
  rect 18x18 smd paste+0 mask+0: 1(-17.5,0) 2(17.5,0)
Mechanical 5:
  region: 41.5,-24 -41.5,-24 -41.5,24 41.5,24
Mechanical 7:
  lines w1: -70.5,111 -20.5,111 ; -41.5,-111 8.5,-111 ; -20.5,0 -20.5,126 ; 0,-11 135.5,-11 ; 0,11 135.5,11 ; 8.5,-126 8.5,0 ; 20.5,-126 20.5,0 20.5,126 ; 70.5,-111 20.5,-111 ; 70.5,111 20.5,111 ; 120.5,-61 120.5,-11 ; 120.5,61 120.5,11 ; -20.5,111 -30.5,116 -30.5,106 -20.5,111 ; 8.5,-111 -1.5,-106 -1.5,-116 8.5,-111 ; 20.5,-111 30.5,-106 30.5,-116 20.5,-111 ; 20.5,111 30.5,116 30.5,106 20.5,111 ; 120.5,-11 115.5,-21 125.5,-21 120.5,-11 ; 120.5,11 115.5,21 125.5,21 120.5,11
  text "Default Padstyle: RX18Y18D0T" at -350,-279 h50
  text "Alternate 1 Padstyle: OX60Y90D30P" at -412.5,-379 h50
  text "Alternate 2 Padstyle: OX90Y60D30P" at -412.5,-479 h50
  text "0.022in/0.559mm" at 140.5,-12.5 h25
  text "0.041in/1.041mm" at -93.75,131 h25
  text "0.012in/0.305mm" at -79.25,-156 h25
Mechanical 13:
  lines w1: -20.5,-11 -20.5,11 ; -20.5,-11 -8.5,-11 -8.5,11 -20.5,11 ; -20.5,-11 20.5,-11 ; -20.5,-11 -20.5,11 ; -20.5,11 20.5,11 ; 20.5,-11 8.5,-11 8.5,11 20.5,11 ; 20.5,-11 20.5,11 ; 20.5,-11 20.5,11
Mechanical 15:
  region: 30.5,-13 -30.5,-13 -30.5,13 30.5,13
  lines w6: -30.5,-13 -30.5,13 30.5,13 30.5,-13 -30.5,-13
3D body: height 10, standoff 0, extent 0,0 10,10

## YAG_CC0402-M [mil]
pads (2):
  rect 34x26 smd paste+0 mask+0: 1(-25.5,0) 2(25.5,0)
Mechanical 5:
  region: 57.5,-28 -57.5,-28 -57.5,28 57.5,28
Mechanical 7:
  lines w1: -70.5,111 -20.5,111 ; -41.5,-111 8.5,-111 ; -20.5,0 -20.5,126 ; 0,-11 135.5,-11 ; 0,11 135.5,11 ; 8.5,-126 8.5,0 ; 20.5,-126 20.5,0 20.5,126 ; 70.5,-111 20.5,-111 ; 70.5,111 20.5,111 ; 120.5,-61 120.5,-11 ; 120.5,61 120.5,11 ; -20.5,111 -30.5,106 -30.5,116 -20.5,111 ; 8.5,-111 -1.5,-116 -1.5,-106 8.5,-111 ; 20.5,-111 30.5,-116 30.5,-106 20.5,-111 ; 20.5,111 30.5,106 30.5,116 20.5,111 ; 120.5,-11 125.5,-21 115.5,-21 120.5,-11 ; 120.5,11 125.5,21 115.5,21 120.5,11
  text "0.012in/0.305mm" at -79.25,-156 h25
  text "0.041in/1.041mm" at -93.75,131 h25
  text "0.022in/0.559mm" at 140.5,-12.5 h25
  text "Alternate 2 Padstyle: OX90Y60D30P" at -412.5,-483 h50
  text "Alternate 1 Padstyle: OX60Y90D30P" at -412.5,-383 h50
  text "Default Padstyle: RX34Y26D0T" at -350,-283 h50
Mechanical 13:
  lines w1: -20.5,-11 -20.5,11 ; -20.5,-11 20.5,-11 ; -20.5,-11 -8.5,-11 -8.5,11 -20.5,11 ; -20.5,-11 -20.5,11 ; -20.5,11 20.5,11 ; 20.5,-11 20.5,11 ; 20.5,-11 20.5,11 ; 20.5,-11 8.5,-11 8.5,11 20.5,11
Mechanical 15:
  region: 62.5,-33 -62.5,-33 -62.5,33 62.5,33
  lines w6: -62.5,-33 62.5,-33 62.5,33 -62.5,33 -62.5,-33
3D body: height 10, standoff 0, extent 0,0 10,10

## YAG_CC0603 [mil]
pads (2):
  rect 32x36 smd paste+0 mask+0: 1(-25.5,0) 2(25.5,0)
Mechanical 5:
  region: 56.5,-33 -56.5,-33 -56.5,33 56.5,33
Mechanical 7:
  lines w1: -83.5,118 -33.5,118 ; -40.5,-118 9.5,-118 ; -33.5,0 -33.5,133 ; 0,-18 148.5,-18 ; 0,18 148.5,18 ; 9.5,-133 9.5,0 ; 33.5,-133 33.5,0 33.5,133 ; 83.5,-118 33.5,-118 ; 83.5,118 33.5,118 ; 133.5,-68 133.5,-18 ; 133.5,68 133.5,18 ; -33.5,118 -43.5,123 -43.5,113 -33.5,118 ; 9.5,-118 -0.5,-113 -0.5,-123 9.5,-118 ; 33.5,-118 43.5,-113 43.5,-123 33.5,-118 ; 33.5,118 43.5,123 43.5,113 33.5,118 ; 133.5,-18 128.5,-28 138.5,-28 133.5,-18 ; 133.5,18 128.5,28 138.5,28 133.5,18
  text "Default Padstyle: RX32Y36D0T" at -350,-288 h50
  text "Alternate 1 Padstyle: OX60Y90D30P" at -412.5,-388 h50
  text "Alternate 2 Padstyle: OX90Y60D30P" at -412.5,-488 h50
  text "0.036in/0.914mm" at 153.5,-12.5 h25
  text "0.067in/1.702mm" at -93.75,138 h25
  text "0.024in/0.61mm" at -66,-163 h25
Mechanical 13:
  lines w1: -33.5,-18 -33.5,18 ; -33.5,-18 -9.5,-18 -9.5,18 -33.5,18 ; -33.5,-18 33.5,-18 ; -33.5,-18 -33.5,18 ; -33.5,18 33.5,18 ; 33.5,-18 9.5,-18 9.5,18 33.5,18 ; 33.5,-18 33.5,18 ; 33.5,-18 33.5,18
Mechanical 15:
  region: 51.5,-28 -51.5,-28 -51.5,28 51.5,28
  lines w6: -51.5,-28 -51.5,28 51.5,28 51.5,-28 -51.5,-28
3D body: height 10, standoff 0, extent 0,0 10,10

## YAG_CC0603-L [mil]
pads (2):
  rect 30x32 smd paste+0 mask+0: 1(-24.5,0) 2(24.5,0)
Mechanical 5:
  region: 54.5,-31 -54.5,-31 -54.5,31 54.5,31
Mechanical 7:
  lines w1: -83.5,118 -33.5,118 ; -40.5,-118 9.5,-118 ; -33.5,0 -33.5,133 ; 0,-18 148.5,-18 ; 0,18 148.5,18 ; 9.5,-133 9.5,0 ; 33.5,-133 33.5,0 33.5,133 ; 83.5,-118 33.5,-118 ; 83.5,118 33.5,118 ; 133.5,-68 133.5,-18 ; 133.5,68 133.5,18 ; -33.5,118 -43.5,123 -43.5,113 -33.5,118 ; 9.5,-118 -0.5,-113 -0.5,-123 9.5,-118 ; 33.5,-118 43.5,-113 43.5,-123 33.5,-118 ; 33.5,118 43.5,123 43.5,113 33.5,118 ; 133.5,-18 128.5,-28 138.5,-28 133.5,-18 ; 133.5,18 128.5,28 138.5,28 133.5,18
  text "Default Padstyle: RX30Y32D0T" at -350,-286 h50
  text "Alternate 1 Padstyle: OX60Y90D30P" at -412.5,-386 h50
  text "Alternate 2 Padstyle: OX90Y60D30P" at -412.5,-486 h50
  text "0.036in/0.914mm" at 153.5,-12.5 h25
  text "0.067in/1.702mm" at -93.75,138 h25
  text "0.024in/0.61mm" at -66,-163 h25
Mechanical 13:
  lines w1: -33.5,-18 -33.5,18 ; -33.5,-18 -9.5,-18 -9.5,18 -33.5,18 ; -33.5,-18 33.5,-18 ; -33.5,-18 -33.5,18 ; -33.5,18 33.5,18 ; 33.5,-18 9.5,-18 9.5,18 33.5,18 ; 33.5,-18 33.5,18 ; 33.5,-18 33.5,18
Mechanical 15:
  region: 43.5,-20 -43.5,-20 -43.5,20 43.5,20
  lines w6: -43.5,-20 -43.5,20 43.5,20 43.5,-20 -43.5,-20
3D body: height 10, standoff 0, extent 0,0 10,10